# Altium footprint library 3.22-杂项.PcbLib: 985 footprints (part 55 of 64)
Each footprint in its own frame and in the unit in brackets; x right, y up, seen from the top. Pads: shape width x height; smd on the part's side, far side on the other; paste and mask are expansions set on the pad; w line width, h text height; cw(c..) or ccw(c..) is an arc to the next point about the centre after c.
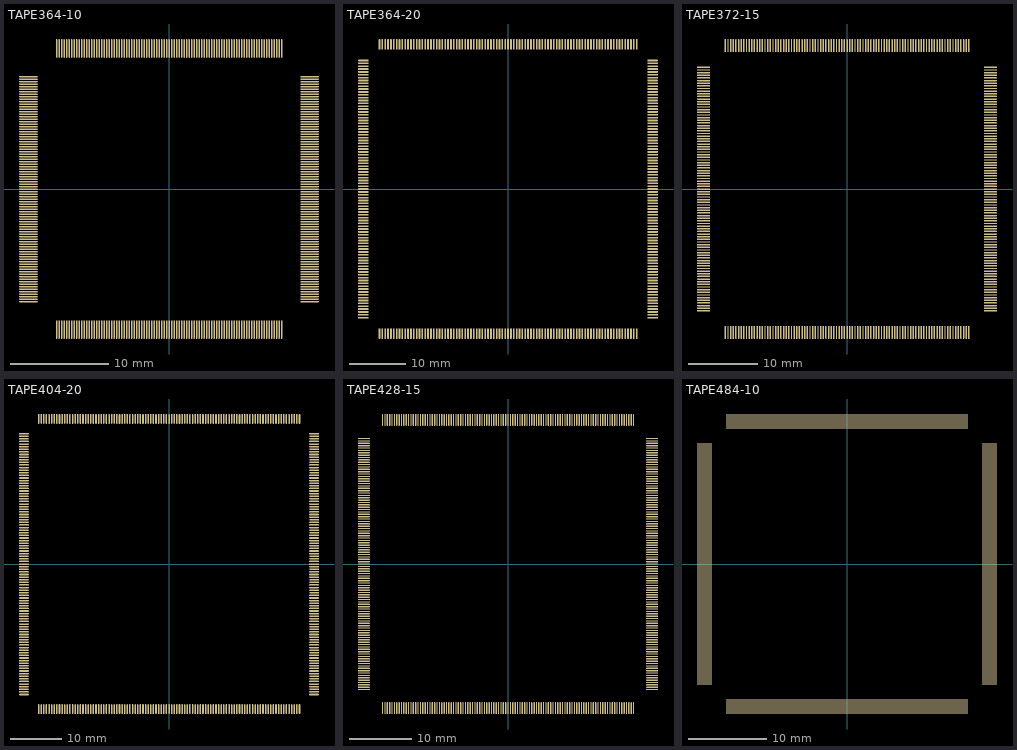
[diagram p54: the footprints below, top view; thin cyan lines are the x and y axes]

## TAPE364-10 [mil]
pads (364):
  oval 75x5 smd: 1(-562.5,449.5) 2(-562.5,439.5) 3(-562.5,429.5) 4(-562.5,419.5) 5(-562.5,409.5) 6(-562.5,399.5) 7(-562.5,389.5) 8(-562.5,379.5) 9(-562.5,369.5) 10(-562.5,359.5) 11(-562.5,349.5) 12(-562.5,339.5) 13(-562.5,329.5) 14(-562.5,319.5) 15(-562.5,309.5) 16(-562.5,299.5) 17(-562.5,289.5) 18(-562.5,279.5) 19(-562.5,269.5) 20(-562.5,259.5) 21(-562.5,249.5) 22(-562.5,239.5) 23(-562.5,229.5) 24(-562.5,219.5) 25(-562.5,209.5) 26(-562.5,199.5) 27(-562.5,189.5) 28(-562.5,179.5) 29(-562.5,169.5) 30(-562.5,159.5) 31(-562.5,149.5) 32(-562.5,139.5) 33(-562.5,129.5) 34(-562.5,119.5) 35(-562.5,109.5) 36(-562.5,99.5) 37(-562.5,89.5) 38(-562.5,79.5) 39(-562.5,69.5) 40(-562.5,59.5) 41(-562.5,49.5) 42(-562.5,39.5) 43(-562.5,29.5) 44(-562.5,19.5) 45(-562.5,9.5) 46(-562.5,-0.5) 47(-562.5,-10.5) 48(-562.5,-20.5) 49(-562.5,-30.5) 50(-562.5,-40.5) 51(-562.5,-50.5) 52(-562.5,-60.5) 53(-562.5,-70.5) 54(-562.5,-80.5) 55(-562.5,-90.5) 56(-562.5,-100.5) 57(-562.5,-110.5) 58(-562.5,-120.5) 59(-562.5,-130.5) 60(-562.5,-140.5) 61(-562.5,-150.5) 62(-562.5,-160.5) 63(-562.5,-170.5) 64(-562.5,-180.5) 65(-562.5,-190.5) 66(-562.5,-200.5) 67(-562.5,-210.5) 68(-562.5,-220.5) 69(-562.5,-230.5) 70(-562.5,-240.5) 71(-562.5,-250.5) 72(-562.5,-260.5) 73(-562.5,-270.5) 74(-562.5,-280.5) 75(-562.5,-290.5) 76(-562.5,-300.5) 77(-562.5,-310.5) 78(-562.5,-320.5) 79(-562.5,-330.5) 80(-562.5,-340.5) 81(-562.5,-350.5) 82(-562.5,-360.5) 83(-562.5,-370.5) 84(-562.5,-380.5) 85(-562.5,-390.5) 86(-562.5,-400.5) 87(-562.5,-410.5) 88(-562.5,-420.5) 89(-562.5,-430.5) 90(-562.5,-440.5) 91(-562.5,-450.5) 183(562.5,-450.5) 184(562.5,-440.5) 185(562.5,-430.5) 186(562.5,-420.5) 187(562.5,-410.5) 188(562.5,-400.5) 189(562.5,-390.5) 190(562.5,-380.5) 191(562.5,-370.5) 192(562.5,-360.5) 193(562.5,-350.5) 194(562.5,-340.5) 195(562.5,-330.5) 196(562.5,-320.5) 197(562.5,-310.5) 198(562.5,-300.5) 199(562.5,-290.5) 200(562.5,-280.5) 201(562.5,-270.5) 202(562.5,-260.5) 203(562.5,-250.5) 204(562.5,-240.5) 205(562.5,-230.5) 206(562.5,-220.5) 207(562.5,-210.5) 208(562.5,-200.5) 209(562.5,-190.5) 210(562.5,-180.5) 211(562.5,-170.5) 212(562.5,-160.5) 213(562.5,-150.5) 214(562.5,-140.5) 215(562.5,-130.5) 216(562.5,-120.5) 217(562.5,-110.5) 218(562.5,-100.5) 219(562.5,-90.5) 220(562.5,-80.5) 221(562.5,-70.5) 222(562.5,-60.5) 223(562.5,-50.5) 224(562.5,-40.5) 225(562.5,-30.5) 226(562.5,-20.5) 227(562.5,-10.5) 228(562.5,-0.5) 229(562.5,9.5) 230(562.5,19.5) 231(562.5,29.5) 232(562.5,39.5) 233(562.5,49.5) 234(562.5,59.5) 235(562.5,69.5) 236(562.5,79.5) 237(562.5,89.5) 238(562.5,99.5) 239(562.5,109.5) 240(562.5,119.5) 241(562.5,129.5) 242(562.5,139.5) 243(562.5,149.5) 244(562.5,159.5) 245(562.5,169.5) 246(562.5,179.5) 247(562.5,189.5) 248(562.5,199.5) 249(562.5,209.5) 250(562.5,219.5) 251(562.5,229.5) 252(562.5,239.5) 253(562.5,249.5) 254(562.5,259.5) 255(562.5,269.5) 256(562.5,279.5) 257(562.5,289.5) 258(562.5,299.5) 259(562.5,309.5) 260(562.5,319.5) 261(562.5,329.5) 262(562.5,339.5) 263(562.5,349.5) 264(562.5,359.5) 265(562.5,369.5) 266(562.5,379.5) 267(562.5,389.5) 268(562.5,399.5) 269(562.5,409.5) 270(562.5,419.5) 271(562.5,429.5) 272(562.5,439.5) 273(562.5,449.5)
  oval 5x75 smd: 92(-449.5,-562.5) 93(-439.5,-562.5) 94(-429.5,-562.5) 95(-419.5,-562.5) 96(-409.5,-562.5) 97(-399.5,-562.5) 98(-389.5,-562.5) 99(-379.5,-562.5) 100(-369.5,-562.5) 101(-359.5,-562.5) 102(-349.5,-562.5) 103(-339.5,-562.5) 104(-329.5,-562.5) 105(-319.5,-562.5) 106(-309.5,-562.5) 107(-299.5,-562.5) 108(-289.5,-562.5) 109(-279.5,-562.5) 110(-269.5,-562.5) 111(-259.5,-562.5) 112(-249.5,-562.5) 113(-239.5,-562.5) 114(-229.5,-562.5) 115(-219.5,-562.5) 116(-209.5,-562.5) 117(-199.5,-562.5) 118(-189.5,-562.5) 119(-179.5,-562.5) 120(-169.5,-562.5) 121(-159.5,-562.5) 122(-149.5,-562.5) 123(-139.5,-562.5) 124(-129.5,-562.5) 125(-119.5,-562.5) 126(-109.5,-562.5) 127(-99.5,-562.5) 128(-89.5,-562.5) 129(-79.5,-562.5) 130(-69.5,-562.5) 131(-59.5,-562.5) 132(-49.5,-562.5) 133(-39.5,-562.5) 134(-29.5,-562.5) 135(-19.5,-562.5) 136(-9.5,-562.5) 137(0.5,-562.5) 138(10.5,-562.5) 139(20.5,-562.5) 140(30.5,-562.5) 141(40.5,-562.5) 142(50.5,-562.5) 143(60.5,-562.5) 144(70.5,-562.5) 145(80.5,-562.5) 146(90.5,-562.5) 147(100.5,-562.5) 148(110.5,-562.5) 149(120.5,-562.5) 150(130.5,-562.5) 151(140.5,-562.5) 152(150.5,-562.5) 153(160.5,-562.5) 154(170.5,-562.5) 155(180.5,-562.5) 156(190.5,-562.5) 157(200.5,-562.5) 158(210.5,-562.5) 159(220.5,-562.5) 160(230.5,-562.5) 161(240.5,-562.5) 162(250.5,-562.5) 163(260.5,-562.5) 164(270.5,-562.5) 165(280.5,-562.5) 166(290.5,-562.5) 167(300.5,-562.5) 168(310.5,-562.5) 169(320.5,-562.5) 170(330.5,-562.5) 171(340.5,-562.5) 172(350.5,-562.5) 173(360.5,-562.5) 174(370.5,-562.5) 175(380.5,-562.5) 176(390.5,-562.5) 177(400.5,-562.5) 178(410.5,-562.5) 179(420.5,-562.5) 180(430.5,-562.5) 181(440.5,-562.5) 182(450.5,-562.5) 274(450.5,562.5) 275(440.5,562.5) 276(430.5,562.5) 277(420.5,562.5) 278(410.5,562.5) 279(400.5,562.5) 280(390.5,562.5) 281(380.5,562.5) 282(370.5,562.5) 283(360.5,562.5) 284(350.5,562.5) 285(340.5,562.5) 286(330.5,562.5) 287(320.5,562.5) 288(310.5,562.5) 289(300.5,562.5) 290(290.5,562.5) 291(280.5,562.5) 292(270.5,562.5) 293(260.5,562.5) 294(250.5,562.5) 295(240.5,562.5) 296(230.5,562.5) 297(220.5,562.5) 298(210.5,562.5) 299(200.5,562.5) 300(190.5,562.5) 301(180.5,562.5) 302(170.5,562.5) 303(160.5,562.5) 304(150.5,562.5) 305(140.5,562.5) 306(130.5,562.5) 307(120.5,562.5) 308(110.5,562.5) 309(100.5,562.5) 310(90.5,562.5) 311(80.5,562.5) 312(70.5,562.5) 313(60.5,562.5) 314(50.5,562.5) 315(40.5,562.5) 316(30.5,562.5) 317(20.5,562.5) 318(10.5,562.5) 319(0.5,562.5) 320(-9.5,562.5) 321(-19.5,562.5) 322(-29.5,562.5) 323(-39.5,562.5) 324(-49.5,562.5) 325(-59.5,562.5) 326(-69.5,562.5) 327(-79.5,562.5) 328(-89.5,562.5) 329(-99.5,562.5) 330(-109.5,562.5) 331(-119.5,562.5) 332(-129.5,562.5) 333(-139.5,562.5) 334(-149.5,562.5) 335(-159.5,562.5) 336(-169.5,562.5) 337(-179.5,562.5) 338(-189.5,562.5) 339(-199.5,562.5) 340(-209.5,562.5) 341(-219.5,562.5) 342(-229.5,562.5) 343(-239.5,562.5) 344(-249.5,562.5) 345(-259.5,562.5) 346(-269.5,562.5) 347(-279.5,562.5) 348(-289.5,562.5) 349(-299.5,562.5) 350(-309.5,562.5) 351(-319.5,562.5) 352(-329.5,562.5) 353(-339.5,562.5) 354(-349.5,562.5) 355(-359.5,562.5) 356(-369.5,562.5) 357(-379.5,562.5) 358(-389.5,562.5) 359(-399.5,562.5) 360(-409.5,562.5) 361(-419.5,562.5) 362(-429.5,562.5) 363(-439.5,562.5) 364(-449.5,562.5)

## TAPE364-20 [mil]
pads (364):
  oval 75x12 smd: 1(-1012.5,899.5) 2(-1012.5,879.5) 3(-1012.5,859.5) 4(-1012.5,839.5) 5(-1012.5,819.5) 6(-1012.5,799.5) 7(-1012.5,779.5) 8(-1012.5,759.5) 9(-1012.5,739.5) 10(-1012.5,719.5) 11(-1012.5,699.5) 12(-1012.5,679.5) 13(-1012.5,659.5) 14(-1012.5,639.5) 15(-1012.5,619.5) 16(-1012.5,599.5) 17(-1012.5,579.5) 18(-1012.5,559.5) 19(-1012.5,539.5) 20(-1012.5,519.5) 21(-1012.5,499.5) 22(-1012.5,479.5) 23(-1012.5,459.5) 24(-1012.5,439.5) 25(-1012.5,419.5) 26(-1012.5,399.5) 27(-1012.5,379.5) 28(-1012.5,359.5) 29(-1012.5,339.5) 30(-1012.5,319.5) 31(-1012.5,299.5) 32(-1012.5,279.5) 33(-1012.5,259.5) 34(-1012.5,239.5) 35(-1012.5,219.5) 36(-1012.5,199.5) 37(-1012.5,179.5) 38(-1012.5,159.5) 39(-1012.5,139.5) 40(-1012.5,119.5) 41(-1012.5,99.5) 42(-1012.5,79.5) 43(-1012.5,59.5) 44(-1012.5,39.5) 45(-1012.5,19.5) 46(-1012.5,-0.5) 47(-1012.5,-20.5) 48(-1012.5,-40.5) 49(-1012.5,-60.5) 50(-1012.5,-80.5) 51(-1012.5,-100.5) 52(-1012.5,-120.5) 53(-1012.5,-140.5) 54(-1012.5,-160.5) 55(-1012.5,-180.5) 56(-1012.5,-200.5) 57(-1012.5,-220.5) 58(-1012.5,-240.5) 59(-1012.5,-260.5) 60(-1012.5,-280.5) 61(-1012.5,-300.5) 62(-1012.5,-320.5) 63(-1012.5,-340.5) 64(-1012.5,-360.5) 65(-1012.5,-380.5) 66(-1012.5,-400.5) 67(-1012.5,-420.5) 68(-1012.5,-440.5) 69(-1012.5,-460.5) 70(-1012.5,-480.5) 71(-1012.5,-500.5) 72(-1012.5,-520.5) 73(-1012.5,-540.5) 74(-1012.5,-560.5) 75(-1012.5,-580.5) 76(-1012.5,-600.5) 77(-1012.5,-620.5) 78(-1012.5,-640.5) 79(-1012.5,-660.5) 80(-1012.5,-680.5) 81(-1012.5,-700.5) 82(-1012.5,-720.5) 83(-1012.5,-740.5) 84(-1012.5,-760.5) 85(-1012.5,-780.5) 86(-1012.5,-800.5) 87(-1012.5,-820.5) 88(-1012.5,-840.5) 89(-1012.5,-860.5) 90(-1012.5,-880.5) 91(-1012.5,-900.5) 183(1012.5,-900.5) 184(1012.5,-880.5) 185(1012.5,-860.5) 186(1012.5,-840.5) 187(1012.5,-820.5) 188(1012.5,-800.5) 189(1012.5,-780.5) 190(1012.5,-760.5) 191(1012.5,-740.5) 192(1012.5,-720.5) 193(1012.5,-700.5) 194(1012.5,-680.5) 195(1012.5,-660.5) 196(1012.5,-640.5) 197(1012.5,-620.5) 198(1012.5,-600.5) 199(1012.5,-580.5) 200(1012.5,-560.5) 201(1012.5,-540.5) 202(1012.5,-520.5) 203(1012.5,-500.5) 204(1012.5,-480.5) 205(1012.5,-460.5) 206(1012.5,-440.5) 207(1012.5,-420.5) 208(1012.5,-400.5) 209(1012.5,-380.5) 210(1012.5,-360.5) 211(1012.5,-340.5) 212(1012.5,-320.5) 213(1012.5,-300.5) 214(1012.5,-280.5) 215(1012.5,-260.5) 216(1012.5,-240.5) 217(1012.5,-220.5) 218(1012.5,-200.5) 219(1012.5,-180.5) 220(1012.5,-160.5) 221(1012.5,-140.5) 222(1012.5,-120.5) 223(1012.5,-100.5) 224(1012.5,-80.5) 225(1012.5,-60.5) 226(1012.5,-40.5) 227(1012.5,-20.5) 228(1012.5,-0.5) 229(1012.5,19.5) 230(1012.5,39.5) 231(1012.5,59.5) 232(1012.5,79.5) 233(1012.5,99.5) 234(1012.5,119.5) 235(1012.5,139.5) 236(1012.5,159.5) 237(1012.5,179.5) 238(1012.5,199.5) 239(1012.5,219.5) 240(1012.5,239.5) 241(1012.5,259.5) 242(1012.5,279.5) 243(1012.5,299.5) 244(1012.5,319.5) 245(1012.5,339.5) 246(1012.5,359.5) 247(1012.5,379.5) 248(1012.5,399.5) 249(1012.5,419.5) 250(1012.5,439.5) 251(1012.5,459.5) 252(1012.5,479.5) 253(1012.5,499.5) 254(1012.5,519.5) 255(1012.5,539.5) 256(1012.5,559.5) 257(1012.5,579.5) 258(1012.5,599.5) 259(1012.5,619.5) 260(1012.5,639.5) 261(1012.5,659.5) 262(1012.5,679.5) 263(1012.5,699.5) 264(1012.5,719.5) 265(1012.5,739.5) 266(1012.5,759.5) 267(1012.5,779.5) 268(1012.5,799.5) 269(1012.5,819.5) 270(1012.5,839.5) 271(1012.5,859.5) 272(1012.5,879.5) 273(1012.5,899.5)
  oval 12x75 smd: 92(-899.5,-1012.5) 93(-879.5,-1012.5) 94(-859.5,-1012.5) 95(-839.5,-1012.5) 96(-819.5,-1012.5) 97(-799.5,-1012.5) 98(-779.5,-1012.5) 99(-759.5,-1012.5) 100(-739.5,-1012.5) 101(-719.5,-1012.5) 102(-699.5,-1012.5) 103(-679.5,-1012.5) 104(-659.5,-1012.5) 105(-639.5,-1012.5) 106(-619.5,-1012.5) 107(-599.5,-1012.5) 108(-579.5,-1012.5) 109(-559.5,-1012.5) 110(-539.5,-1012.5) 111(-519.5,-1012.5) 112(-499.5,-1012.5) 113(-479.5,-1012.5) 114(-459.5,-1012.5) 115(-439.5,-1012.5) 116(-419.5,-1012.5) 117(-399.5,-1012.5) 118(-379.5,-1012.5) 119(-359.5,-1012.5) 120(-339.5,-1012.5) 121(-319.5,-1012.5) 122(-299.5,-1012.5) 123(-279.5,-1012.5) 124(-259.5,-1012.5) 125(-239.5,-1012.5) 126(-219.5,-1012.5) 127(-199.5,-1012.5) 128(-179.5,-1012.5) 129(-159.5,-1012.5) 130(-139.5,-1012.5) 131(-119.5,-1012.5) 132(-99.5,-1012.5) 133(-79.5,-1012.5) 134(-59.5,-1012.5) 135(-39.5,-1012.5) 136(-19.5,-1012.5) 137(0.5,-1012.5) 138(20.5,-1012.5) 139(40.5,-1012.5) 140(60.5,-1012.5) 141(80.5,-1012.5) 142(100.5,-1012.5) 143(120.5,-1012.5) 144(140.5,-1012.5) 145(160.5,-1012.5) 146(180.5,-1012.5) 147(200.5,-1012.5) 148(220.5,-1012.5) 149(240.5,-1012.5) 150(260.5,-1012.5) 151(280.5,-1012.5) 152(300.5,-1012.5) 153(320.5,-1012.5) 154(340.5,-1012.5) 155(360.5,-1012.5) 156(380.5,-1012.5) 157(400.5,-1012.5) 158(420.5,-1012.5) 159(440.5,-1012.5) 160(460.5,-1012.5) 161(480.5,-1012.5) 162(500.5,-1012.5) 163(520.5,-1012.5) 164(540.5,-1012.5) 165(560.5,-1012.5) 166(580.5,-1012.5) 167(600.5,-1012.5) 168(620.5,-1012.5) 169(640.5,-1012.5) 170(660.5,-1012.5) 171(680.5,-1012.5) 172(700.5,-1012.5) 173(720.5,-1012.5) 174(740.5,-1012.5) 175(760.5,-1012.5) 176(780.5,-1012.5) 177(800.5,-1012.5) 178(820.5,-1012.5) 179(840.5,-1012.5) 180(860.5,-1012.5) 181(880.5,-1012.5) 182(900.5,-1012.5) 274(900.5,1012.5) 275(880.5,1012.5) 276(860.5,1012.5) 277(840.5,1012.5) 278(820.5,1012.5) 279(800.5,1012.5) 280(780.5,1012.5) 281(760.5,1012.5) 282(740.5,1012.5) 283(720.5,1012.5) 284(700.5,1012.5) 285(680.5,1012.5) 286(660.5,1012.5) 287(640.5,1012.5) 288(620.5,1012.5) 289(600.5,1012.5) 290(580.5,1012.5) 291(560.5,1012.5) 292(540.5,1012.5) 293(520.5,1012.5) 294(500.5,1012.5) 295(480.5,1012.5) 296(460.5,1012.5) 297(440.5,1012.5) 298(420.5,1012.5) 299(400.5,1012.5) 300(380.5,1012.5) 301(360.5,1012.5) 302(340.5,1012.5) 303(320.5,1012.5) 304(300.5,1012.5) 305(280.5,1012.5) 306(260.5,1012.5) 307(240.5,1012.5) 308(220.5,1012.5) 309(200.5,1012.5) 310(180.5,1012.5) 311(160.5,1012.5) 312(140.5,1012.5) 313(120.5,1012.5) 314(100.5,1012.5) 315(80.5,1012.5) 316(60.5,1012.5) 317(40.5,1012.5) 318(20.5,1012.5) 319(0.5,1012.5) 320(-19.5,1012.5) 321(-39.5,1012.5) 322(-59.5,1012.5) 323(-79.5,1012.5) 324(-99.5,1012.5) 325(-119.5,1012.5) 326(-139.5,1012.5) 327(-159.5,1012.5) 328(-179.5,1012.5) 329(-199.5,1012.5) 330(-219.5,1012.5) 331(-239.5,1012.5) 332(-259.5,1012.5) 333(-279.5,1012.5) 334(-299.5,1012.5) 335(-319.5,1012.5) 336(-339.5,1012.5) 337(-359.5,1012.5) 338(-379.5,1012.5) 339(-399.5,1012.5) 340(-419.5,1012.5) 341(-439.5,1012.5) 342(-459.5,1012.5) 343(-479.5,1012.5) 344(-499.5,1012.5) 345(-519.5,1012.5) 346(-539.5,1012.5) 347(-559.5,1012.5) 348(-579.5,1012.5) 349(-599.5,1012.5) 350(-619.5,1012.5) 351(-639.5,1012.5) 352(-659.5,1012.5) 353(-679.5,1012.5) 354(-699.5,1012.5) 355(-719.5,1012.5) 356(-739.5,1012.5) 357(-759.5,1012.5) 358(-779.5,1012.5) 359(-799.5,1012.5) 360(-819.5,1012.5) 361(-839.5,1012.5) 362(-859.5,1012.5) 363(-879.5,1012.5) 364(-899.5,1012.5)

## TAPE372-15 [mil]
pads (372):
  oval 75x8 smd: 1(-812.5,689.5) 2(-812.5,674.5) 3(-812.5,659.5) 4(-812.5,644.5) 5(-812.5,629.5) 6(-812.5,614.5) 7(-812.5,599.5) 8(-812.5,584.5) 9(-812.5,569.5) 10(-812.5,554.5) 11(-812.5,539.5) 12(-812.5,524.5) 13(-812.5,509.5) 14(-812.5,494.5) 15(-812.5,479.5) 16(-812.5,464.5) 17(-812.5,449.5) 18(-812.5,434.5) 19(-812.5,419.5) 20(-812.5,404.5) 21(-812.5,389.5) 22(-812.5,374.5) 23(-812.5,359.5) 24(-812.5,344.5) 25(-812.5,329.5) 26(-812.5,314.5) 27(-812.5,299.5) 28(-812.5,284.5) 29(-812.5,269.5) 30(-812.5,254.5) 31(-812.5,239.5) 32(-812.5,224.5) 33(-812.5,209.5) 34(-812.5,194.5) 35(-812.5,179.5) 36(-812.5,164.5) 37(-812.5,149.5) 38(-812.5,134.5) 39(-812.5,119.5) 40(-812.5,104.5) 41(-812.5,89.5) 42(-812.5,74.5) 43(-812.5,59.5) 44(-812.5,44.5) 45(-812.5,29.5) 46(-812.5,14.5) 47(-812.5,-0.5) 48(-812.5,-15.5) 49(-812.5,-30.5) 50(-812.5,-45.5) 51(-812.5,-60.5) 52(-812.5,-75.5) 53(-812.5,-90.5) 54(-812.5,-105.5) 55(-812.5,-120.5) 56(-812.5,-135.5) 57(-812.5,-150.5) 58(-812.5,-165.5) 59(-812.5,-180.5) 60(-812.5,-195.5) 61(-812.5,-210.5) 62(-812.5,-225.5) 63(-812.5,-240.5) 64(-812.5,-255.5) 65(-812.5,-270.5) 66(-812.5,-285.5) 67(-812.5,-300.5) 68(-812.5,-315.5) 69(-812.5,-330.5) 70(-812.5,-345.5) 71(-812.5,-360.5) 72(-812.5,-375.5) 73(-812.5,-390.5) 74(-812.5,-405.5) 75(-812.5,-420.5) 76(-812.5,-435.5) 77(-812.5,-450.5) 78(-812.5,-465.5) 79(-812.5,-480.5) 80(-812.5,-495.5) 81(-812.5,-510.5) 82(-812.5,-525.5) 83(-812.5,-540.5) 84(-812.5,-555.5) 85(-812.5,-570.5) 86(-812.5,-585.5) 87(-812.5,-600.5) 88(-812.5,-615.5) 89(-812.5,-630.5) 90(-812.5,-645.5) 91(-812.5,-660.5) 92(-812.5,-675.5) 93(-812.5,-690.5) 187(812.5,-690.5) 188(812.5,-675.5) 189(812.5,-660.5) 190(812.5,-645.5) 191(812.5,-630.5) 192(812.5,-615.5) 193(812.5,-600.5) 194(812.5,-585.5) 195(812.5,-570.5) 196(812.5,-555.5) 197(812.5,-540.5) 198(812.5,-525.5) 199(812.5,-510.5) 200(812.5,-495.5) 201(812.5,-480.5) 202(812.5,-465.5) 203(812.5,-450.5) 204(812.5,-435.5) 205(812.5,-420.5) 206(812.5,-405.5) 207(812.5,-390.5) 208(812.5,-375.5) 209(812.5,-360.5) 210(812.5,-345.5) 211(812.5,-330.5) 212(812.5,-315.5) 213(812.5,-300.5) 214(812.5,-285.5) 215(812.5,-270.5) 216(812.5,-255.5) 217(812.5,-240.5) 218(812.5,-225.5) 219(812.5,-210.5) 220(812.5,-195.5) 221(812.5,-180.5) 222(812.5,-165.5) 223(812.5,-150.5) 224(812.5,-135.5) 225(812.5,-120.5) 226(812.5,-105.5) 227(812.5,-90.5) 228(812.5,-75.5) 229(812.5,-60.5) 230(812.5,-45.5) 231(812.5,-30.5) 232(812.5,-15.5) 233(812.5,-0.5) 234(812.5,14.5) 235(812.5,29.5) 236(812.5,44.5) 237(812.5,59.5) 238(812.5,74.5) 239(812.5,89.5) 240(812.5,104.5) 241(812.5,119.5) 242(812.5,134.5) 243(812.5,149.5) 244(812.5,164.5) 245(812.5,179.5) 246(812.5,194.5) 247(812.5,209.5) 248(812.5,224.5) 249(812.5,239.5) 250(812.5,254.5) 251(812.5,269.5) 252(812.5,284.5) 253(812.5,299.5) 254(812.5,314.5) 255(812.5,329.5) 256(812.5,344.5) 257(812.5,359.5) 258(812.5,374.5) 259(812.5,389.5) 260(812.5,404.5) 261(812.5,419.5) 262(812.5,434.5) 263(812.5,449.5) 264(812.5,464.5) 265(812.5,479.5) 266(812.5,494.5) 267(812.5,509.5) 268(812.5,524.5) 269(812.5,539.5) 270(812.5,554.5) 271(812.5,569.5) 272(812.5,584.5) 273(812.5,599.5) 274(812.5,614.5) 275(812.5,629.5) 276(812.5,644.5) 277(812.5,659.5) 278(812.5,674.5) 279(812.5,689.5)
  oval 8x75 smd: 94(-689.5,-812.5) 95(-674.5,-812.5) 96(-659.5,-812.5) 97(-644.5,-812.5) 98(-629.5,-812.5) 99(-614.5,-812.5) 100(-599.5,-812.5) 101(-584.5,-812.5) 102(-569.5,-812.5) 103(-554.5,-812.5) 104(-539.5,-812.5) 105(-524.5,-812.5) 106(-509.5,-812.5) 107(-494.5,-812.5) 108(-479.5,-812.5) 109(-464.5,-812.5) 110(-449.5,-812.5) 111(-434.5,-812.5) 112(-419.5,-812.5) 113(-404.5,-812.5) 114(-389.5,-812.5) 115(-374.5,-812.5) 116(-359.5,-812.5) 117(-344.5,-812.5) 118(-329.5,-812.5) 119(-314.5,-812.5) 120(-299.5,-812.5) 121(-284.5,-812.5) 122(-269.5,-812.5) 123(-254.5,-812.5) 124(-239.5,-812.5) 125(-224.5,-812.5) 126(-209.5,-812.5) 127(-194.5,-812.5) 128(-179.5,-812.5) 129(-164.5,-812.5) 130(-149.5,-812.5) 131(-134.5,-812.5) 132(-119.5,-812.5) 133(-104.5,-812.5) 134(-89.5,-812.5) 135(-74.5,-812.5) 136(-59.5,-812.5) 137(-44.5,-812.5) 138(-29.5,-812.5) 139(-14.5,-812.5) 140(0.5,-812.5) 141(15.5,-812.5) 142(30.5,-812.5) 143(45.5,-812.5) 144(60.5,-812.5) 145(75.5,-812.5) 146(90.5,-812.5) 147(105.5,-812.5) 148(120.5,-812.5) 149(135.5,-812.5) 150(150.5,-812.5) 151(165.5,-812.5) 152(180.5,-812.5) 153(195.5,-812.5) 154(210.5,-812.5) 155(225.5,-812.5) 156(240.5,-812.5) 157(255.5,-812.5) 158(270.5,-812.5) 159(285.5,-812.5) 160(300.5,-812.5) 161(315.5,-812.5) 162(330.5,-812.5) 163(345.5,-812.5) 164(360.5,-812.5) 165(375.5,-812.5) 166(390.5,-812.5) 167(405.5,-812.5) 168(420.5,-812.5) 169(435.5,-812.5) 170(450.5,-812.5) 171(465.5,-812.5) 172(480.5,-812.5) 173(495.5,-812.5) 174(510.5,-812.5) 175(525.5,-812.5) 176(540.5,-812.5) 177(555.5,-812.5) 178(570.5,-812.5) 179(585.5,-812.5) 180(600.5,-812.5) 181(615.5,-812.5) 182(630.5,-812.5) 183(645.5,-812.5) 184(660.5,-812.5) 185(675.5,-812.5) 186(690.5,-812.5) 280(690.5,812.5) 281(675.5,812.5) 282(660.5,812.5) 283(645.5,812.5) 284(630.5,812.5) 285(615.5,812.5) 286(600.5,812.5) 287(585.5,812.5) 288(570.5,812.5) 289(555.5,812.5) 290(540.5,812.5) 291(525.5,812.5) 292(510.5,812.5) 293(495.5,812.5) 294(480.5,812.5) 295(465.5,812.5) 296(450.5,812.5) 297(435.5,812.5) 298(420.5,812.5) 299(405.5,812.5) 300(390.5,812.5) 301(375.5,812.5) 302(360.5,812.5) 303(345.5,812.5) 304(330.5,812.5) 305(315.5,812.5) 306(300.5,812.5) 307(285.5,812.5) 308(270.5,812.5) 309(255.5,812.5) 310(240.5,812.5) 311(225.5,812.5) 312(210.5,812.5) 313(195.5,812.5) 314(180.5,812.5) 315(165.5,812.5) 316(150.5,812.5) 317(135.5,812.5) 318(120.5,812.5) 319(105.5,812.5) 320(90.5,812.5) 321(75.5,812.5) 322(60.5,812.5) 323(45.5,812.5) 324(30.5,812.5) 325(15.5,812.5) 326(0.5,812.5) 327(-14.5,812.5) 328(-29.5,812.5) 329(-44.5,812.5) 330(-59.5,812.5) 331(-74.5,812.5) 332(-89.5,812.5) 333(-104.5,812.5) 334(-119.5,812.5) 335(-134.5,812.5) 336(-149.5,812.5) 337(-164.5,812.5) 338(-179.5,812.5) 339(-194.5,812.5) 340(-209.5,812.5) 341(-224.5,812.5) 342(-239.5,812.5) 343(-254.5,812.5) 344(-269.5,812.5) 345(-284.5,812.5) 346(-299.5,812.5) 347(-314.5,812.5) 348(-329.5,812.5) 349(-344.5,812.5) 350(-359.5,812.5) 351(-374.5,812.5) 352(-389.5,812.5) 353(-404.5,812.5) 354(-419.5,812.5) 355(-434.5,812.5) 356(-449.5,812.5) 357(-464.5,812.5) 358(-479.5,812.5) 359(-494.5,812.5) 360(-509.5,812.5) 361(-524.5,812.5) 362(-539.5,812.5) 363(-554.5,812.5) 364(-569.5,812.5) 365(-584.5,812.5) 366(-599.5,812.5) 367(-614.5,812.5) 368(-629.5,812.5) 369(-644.5,812.5) 370(-659.5,812.5) 371(-674.5,812.5) 372(-689.5,812.5)

## TAPE404-20 [mil]
pads (404):
  oval 75x12 smd: 1(-1112.5,999.5) 2(-1112.5,979.5) 3(-1112.5,959.5) 4(-1112.5,939.5) 5(-1112.5,919.5) 6(-1112.5,899.5) 7(-1112.5,879.5) 8(-1112.5,859.5) 9(-1112.5,839.5) 10(-1112.5,819.5) 11(-1112.5,799.5) 12(-1112.5,779.5) 13(-1112.5,759.5) 14(-1112.5,739.5) 15(-1112.5,719.5) 16(-1112.5,699.5) 17(-1112.5,679.5) 18(-1112.5,659.5) 19(-1112.5,639.5) 20(-1112.5,619.5) 21(-1112.5,599.5) 22(-1112.5,579.5) 23(-1112.5,559.5) 24(-1112.5,539.5) 25(-1112.5,519.5) 26(-1112.5,499.5) 27(-1112.5,479.5) 28(-1112.5,459.5) 29(-1112.5,439.5) 30(-1112.5,419.5) 31(-1112.5,399.5) 32(-1112.5,379.5) 33(-1112.5,359.5) 34(-1112.5,339.5) 35(-1112.5,319.5) 36(-1112.5,299.5) 37(-1112.5,279.5) 38(-1112.5,259.5) 39(-1112.5,239.5) 40(-1112.5,219.5) 41(-1112.5,199.5) 42(-1112.5,179.5) 43(-1112.5,159.5) 44(-1112.5,139.5) 45(-1112.5,119.5) 46(-1112.5,99.5) 47(-1112.5,79.5) 48(-1112.5,59.5) 49(-1112.5,39.5) 50(-1112.5,19.5) 51(-1112.5,-0.5) 52(-1112.5,-20.5) 53(-1112.5,-40.5) 54(-1112.5,-60.5) 55(-1112.5,-80.5) 56(-1112.5,-100.5) 57(-1112.5,-120.5) 58(-1112.5,-140.5) 59(-1112.5,-160.5) 60(-1112.5,-180.5) 61(-1112.5,-200.5) 62(-1112.5,-220.5) 63(-1112.5,-240.5) 64(-1112.5,-260.5) 65(-1112.5,-280.5) 66(-1112.5,-300.5) 67(-1112.5,-320.5) 68(-1112.5,-340.5) 69(-1112.5,-360.5) 70(-1112.5,-380.5) 71(-1112.5,-400.5) 72(-1112.5,-420.5) 73(-1112.5,-440.5) 74(-1112.5,-460.5) 75(-1112.5,-480.5) 76(-1112.5,-500.5) 77(-1112.5,-520.5) 78(-1112.5,-540.5) 79(-1112.5,-560.5) 80(-1112.5,-580.5) 81(-1112.5,-600.5) 82(-1112.5,-620.5) 83(-1112.5,-640.5) 84(-1112.5,-660.5) 85(-1112.5,-680.5) 86(-1112.5,-700.5) 87(-1112.5,-720.5) 88(-1112.5,-740.5) 89(-1112.5,-760.5) 90(-1112.5,-780.5) 91(-1112.5,-800.5) 92(-1112.5,-820.5) 93(-1112.5,-840.5) 94(-1112.5,-860.5) 95(-1112.5,-880.5) 96(-1112.5,-900.5) 97(-1112.5,-920.5) 98(-1112.5,-940.5) 99(-1112.5,-960.5) 100(-1112.5,-980.5) 101(-1112.5,-1000.5) 203(1112.5,-1000.5) 204(1112.5,-980.5) 205(1112.5,-960.5) 206(1112.5,-940.5) 207(1112.5,-920.5) 208(1112.5,-900.5) 209(1112.5,-880.5) 210(1112.5,-860.5) 211(1112.5,-840.5) 212(1112.5,-820.5) 213(1112.5,-800.5) 214(1112.5,-780.5) 215(1112.5,-760.5) 216(1112.5,-740.5) 217(1112.5,-720.5) 218(1112.5,-700.5) 219(1112.5,-680.5) 220(1112.5,-660.5) 221(1112.5,-640.5) 222(1112.5,-620.5) 223(1112.5,-600.5) 224(1112.5,-580.5) 225(1112.5,-560.5) 226(1112.5,-540.5) 227(1112.5,-520.5) 228(1112.5,-500.5) 229(1112.5,-480.5) 230(1112.5,-460.5) 231(1112.5,-440.5) 232(1112.5,-420.5) 233(1112.5,-400.5) 234(1112.5,-380.5) 235(1112.5,-360.5) 236(1112.5,-340.5) 237(1112.5,-320.5) 238(1112.5,-300.5) 239(1112.5,-280.5) 240(1112.5,-260.5) 241(1112.5,-240.5) 242(1112.5,-220.5) 243(1112.5,-200.5) 244(1112.5,-180.5) 245(1112.5,-160.5) 246(1112.5,-140.5) 247(1112.5,-120.5) 248(1112.5,-100.5) 249(1112.5,-80.5) 250(1112.5,-60.5) 251(1112.5,-40.5) 252(1112.5,-20.5) 253(1112.5,-0.5) 254(1112.5,19.5) 255(1112.5,39.5) 256(1112.5,59.5) 257(1112.5,79.5) 258(1112.5,99.5) 259(1112.5,119.5) 260(1112.5,139.5) 261(1112.5,159.5) 262(1112.5,179.5) 263(1112.5,199.5) 264(1112.5,219.5) 265(1112.5,239.5) 266(1112.5,259.5) 267(1112.5,279.5) 268(1112.5,299.5) 269(1112.5,319.5) 270(1112.5,339.5) 271(1112.5,359.5) 272(1112.5,379.5) 273(1112.5,399.5) 274(1112.5,419.5) 275(1112.5,439.5) 276(1112.5,459.5) 277(1112.5,479.5) 278(1112.5,499.5) 279(1112.5,519.5) 280(1112.5,539.5) 281(1112.5,559.5) 282(1112.5,579.5) 283(1112.5,599.5) 284(1112.5,619.5) 285(1112.5,639.5) 286(1112.5,659.5) 287(1112.5,679.5) 288(1112.5,699.5) 289(1112.5,719.5) 290(1112.5,739.5) 291(1112.5,759.5) 292(1112.5,779.5) 293(1112.5,799.5) 294(1112.5,819.5) 295(1112.5,839.5) 296(1112.5,859.5) 297(1112.5,879.5) 298(1112.5,899.5) 299(1112.5,919.5) 300(1112.5,939.5) 301(1112.5,959.5) 302(1112.5,979.5) 303(1112.5,999.5)
  oval 12x75 smd: 102(-999.5,-1112.5) 103(-979.5,-1112.5) 104(-959.5,-1112.5) 105(-939.5,-1112.5) 106(-919.5,-1112.5) 107(-899.5,-1112.5) 108(-879.5,-1112.5) 109(-859.5,-1112.5) 110(-839.5,-1112.5) 111(-819.5,-1112.5) 112(-799.5,-1112.5) 113(-779.5,-1112.5) 114(-759.5,-1112.5) 115(-739.5,-1112.5) 116(-719.5,-1112.5) 117(-699.5,-1112.5) 118(-679.5,-1112.5) 119(-659.5,-1112.5) 120(-639.5,-1112.5) 121(-619.5,-1112.5) 122(-599.5,-1112.5) 123(-579.5,-1112.5) 124(-559.5,-1112.5) 125(-539.5,-1112.5) 126(-519.5,-1112.5) 127(-499.5,-1112.5) 128(-479.5,-1112.5) 129(-459.5,-1112.5) 130(-439.5,-1112.5) 131(-419.5,-1112.5) 132(-399.5,-1112.5) 133(-379.5,-1112.5) 134(-359.5,-1112.5) 135(-339.5,-1112.5) 136(-319.5,-1112.5) 137(-299.5,-1112.5) 138(-279.5,-1112.5) 139(-259.5,-1112.5) 140(-239.5,-1112.5) 141(-219.5,-1112.5) 142(-199.5,-1112.5) 143(-179.5,-1112.5) 144(-159.5,-1112.5) 145(-139.5,-1112.5) 146(-119.5,-1112.5) 147(-99.5,-1112.5) 148(-79.5,-1112.5) 149(-59.5,-1112.5) 150(-39.5,-1112.5) 151(-19.5,-1112.5) 152(0.5,-1112.5) 153(20.5,-1112.5) 154(40.5,-1112.5) 155(60.5,-1112.5) 156(80.5,-1112.5) 157(100.5,-1112.5) 158(120.5,-1112.5) 159(140.5,-1112.5) 160(160.5,-1112.5) 161(180.5,-1112.5) 162(200.5,-1112.5) 163(220.5,-1112.5) 164(240.5,-1112.5) 165(260.5,-1112.5) 166(280.5,-1112.5) 167(300.5,-1112.5) 168(320.5,-1112.5) 169(340.5,-1112.5) 170(360.5,-1112.5) 171(380.5,-1112.5) 172(400.5,-1112.5) 173(420.5,-1112.5) 174(440.5,-1112.5) 175(460.5,-1112.5) 176(480.5,-1112.5) 177(500.5,-1112.5) 178(520.5,-1112.5) 179(540.5,-1112.5) 180(560.5,-1112.5) 181(580.5,-1112.5) 182(600.5,-1112.5) 183(620.5,-1112.5) 184(640.5,-1112.5) 185(660.5,-1112.5) 186(680.5,-1112.5) 187(700.5,-1112.5) 188(720.5,-1112.5) 189(740.5,-1112.5) 190(760.5,-1112.5) 191(780.5,-1112.5) 192(800.5,-1112.5) 193(820.5,-1112.5) 194(840.5,-1112.5) 195(860.5,-1112.5) 196(880.5,-1112.5) 197(900.5,-1112.5) 198(920.5,-1112.5) 199(940.5,-1112.5) 200(960.5,-1112.5) 201(980.5,-1112.5) 202(1000.5,-1112.5) 304(1000.5,1112.5) 305(980.5,1112.5) 306(960.5,1112.5) 307(940.5,1112.5) 308(920.5,1112.5) 309(900.5,1112.5) 310(880.5,1112.5) 311(860.5,1112.5) 312(840.5,1112.5) 313(820.5,1112.5) 314(800.5,1112.5) 315(780.5,1112.5) 316(760.5,1112.5) 317(740.5,1112.5) 318(720.5,1112.5) 319(700.5,1112.5) 320(680.5,1112.5) 321(660.5,1112.5) 322(640.5,1112.5) 323(620.5,1112.5) 324(600.5,1112.5) 325(580.5,1112.5) 326(560.5,1112.5) 327(540.5,1112.5) 328(520.5,1112.5) 329(500.5,1112.5) 330(480.5,1112.5) 331(460.5,1112.5) 332(440.5,1112.5) 333(420.5,1112.5) 334(400.5,1112.5) 335(380.5,1112.5) 336(360.5,1112.5) 337(340.5,1112.5) 338(320.5,1112.5) 339(300.5,1112.5) 340(280.5,1112.5) 341(260.5,1112.5) 342(240.5,1112.5) 343(220.5,1112.5) 344(200.5,1112.5) 345(180.5,1112.5) 346(160.5,1112.5) 347(140.5,1112.5) 348(120.5,1112.5) 349(100.5,1112.5) 350(80.5,1112.5) 351(60.5,1112.5) 352(40.5,1112.5) 353(20.5,1112.5) 354(0.5,1112.5) 355(-19.5,1112.5) 356(-39.5,1112.5) 357(-59.5,1112.5) 358(-79.5,1112.5) 359(-99.5,1112.5) 360(-119.5,1112.5) 361(-139.5,1112.5) 362(-159.5,1112.5) 363(-179.5,1112.5) 364(-199.5,1112.5) 365(-219.5,1112.5) 366(-239.5,1112.5) 367(-259.5,1112.5) 368(-279.5,1112.5) 369(-299.5,1112.5) 370(-319.5,1112.5) 371(-339.5,1112.5) 372(-359.5,1112.5) 373(-379.5,1112.5) 374(-399.5,1112.5) 375(-419.5,1112.5) 376(-439.5,1112.5) 377(-459.5,1112.5) 378(-479.5,1112.5) 379(-499.5,1112.5) 380(-519.5,1112.5) 381(-539.5,1112.5) 382(-559.5,1112.5) 383(-579.5,1112.5) 384(-599.5,1112.5) 385(-619.5,1112.5) 386(-639.5,1112.5) 387(-659.5,1112.5) 388(-679.5,1112.5) 389(-699.5,1112.5) 390(-719.5,1112.5) 391(-739.5,1112.5) 392(-759.5,1112.5) 393(-779.5,1112.5) 394(-799.5,1112.5) 395(-819.5,1112.5) 396(-839.5,1112.5) 397(-859.5,1112.5) 398(-879.5,1112.5) 399(-899.5,1112.5) 400(-919.5,1112.5) 401(-939.5,1112.5) 402(-959.5,1112.5) 403(-979.5,1112.5) 404(-999.5,1112.5)

## TAPE428-15 [mil]
pads (428):
  oval 75x8 smd: 1(-912.5,794.5) 2(-912.5,779.5) 3(-912.5,764.5) 4(-912.5,749.5) 5(-912.5,734.5) 6(-912.5,719.5) 7(-912.5,704.5) 8(-912.5,689.5) 9(-912.5,674.5) 10(-912.5,659.5) 11(-912.5,644.5) 12(-912.5,629.5) 13(-912.5,614.5) 14(-912.5,599.5) 15(-912.5,584.5) 16(-912.5,569.5) 17(-912.5,554.5) 18(-912.5,539.5) 19(-912.5,524.5) 20(-912.5,509.5) 21(-912.5,494.5) 22(-912.5,479.5) 23(-912.5,464.5) 24(-912.5,449.5) 25(-912.5,434.5) 26(-912.5,419.5) 27(-912.5,404.5) 28(-912.5,389.5) 29(-912.5,374.5) 30(-912.5,359.5) 31(-912.5,344.5) 32(-912.5,329.5) 33(-912.5,314.5) 34(-912.5,299.5) 35(-912.5,284.5) 36(-912.5,269.5) 37(-912.5,254.5) 38(-912.5,239.5) 39(-912.5,224.5) 40(-912.5,209.5) 41(-912.5,194.5) 42(-912.5,179.5) 43(-912.5,164.5) 44(-912.5,149.5) 45(-912.5,134.5) 46(-912.5,119.5) 47(-912.5,104.5) 48(-912.5,89.5) 49(-912.5,74.5) 50(-912.5,59.5) 51(-912.5,44.5) 52(-912.5,29.5) 53(-912.5,14.5) 54(-912.5,-0.5) 55(-912.5,-15.5) 56(-912.5,-30.5) 57(-912.5,-45.5) 58(-912.5,-60.5) 59(-912.5,-75.5) 60(-912.5,-90.5) 61(-912.5,-105.5) 62(-912.5,-120.5) 63(-912.5,-135.5) 64(-912.5,-150.5) 65(-912.5,-165.5) 66(-912.5,-180.5) 67(-912.5,-195.5) 68(-912.5,-210.5) 69(-912.5,-225.5) 70(-912.5,-240.5) 71(-912.5,-255.5) 72(-912.5,-270.5) 73(-912.5,-285.5) 74(-912.5,-300.5) 75(-912.5,-315.5) 76(-912.5,-330.5) 77(-912.5,-345.5) 78(-912.5,-360.5) 79(-912.5,-375.5) 80(-912.5,-390.5) 81(-912.5,-405.5) 82(-912.5,-420.5) 83(-912.5,-435.5) 84(-912.5,-450.5) 85(-912.5,-465.5) 86(-912.5,-480.5) 87(-912.5,-495.5) 88(-912.5,-510.5) 89(-912.5,-525.5) 90(-912.5,-540.5) 91(-912.5,-555.5) 92(-912.5,-570.5) 93(-912.5,-585.5) 94(-912.5,-600.5) 95(-912.5,-615.5) 96(-912.5,-630.5) 97(-912.5,-645.5) 98(-912.5,-660.5) 99(-912.5,-675.5) 100(-912.5,-690.5) 101(-912.5,-705.5) 102(-912.5,-720.5) 103(-912.5,-735.5) 104(-912.5,-750.5) 105(-912.5,-765.5) 106(-912.5,-780.5) 107(-912.5,-795.5) 215(912.5,-795.5) 216(912.5,-780.5) 217(912.5,-765.5) 218(912.5,-750.5) 219(912.5,-735.5) 220(912.5,-720.5) 221(912.5,-705.5) 222(912.5,-690.5) 223(912.5,-675.5) 224(912.5,-660.5) 225(912.5,-645.5) 226(912.5,-630.5) 227(912.5,-615.5) 228(912.5,-600.5) 229(912.5,-585.5) 230(912.5,-570.5) 231(912.5,-555.5) 232(912.5,-540.5) 233(912.5,-525.5) 234(912.5,-510.5) 235(912.5,-495.5) 236(912.5,-480.5) 237(912.5,-465.5) 238(912.5,-450.5) 239(912.5,-435.5) 240(912.5,-420.5) 241(912.5,-405.5) 242(912.5,-390.5) 243(912.5,-375.5) 244(912.5,-360.5) 245(912.5,-345.5) 246(912.5,-330.5) 247(912.5,-315.5) 248(912.5,-300.5) 249(912.5,-285.5) 250(912.5,-270.5) 251(912.5,-255.5) 252(912.5,-240.5) 253(912.5,-225.5) 254(912.5,-210.5) 255(912.5,-195.5) 256(912.5,-180.5) 257(912.5,-165.5) 258(912.5,-150.5) 259(912.5,-135.5) 260(912.5,-120.5) 261(912.5,-105.5) 262(912.5,-90.5) 263(912.5,-75.5) 264(912.5,-60.5) 265(912.5,-45.5) 266(912.5,-30.5) 267(912.5,-15.5) 268(912.5,-0.5) 269(912.5,14.5) 270(912.5,29.5) 271(912.5,44.5) 272(912.5,59.5) 273(912.5,74.5) 274(912.5,89.5) 275(912.5,104.5) 276(912.5,119.5) 277(912.5,134.5) 278(912.5,149.5) 279(912.5,164.5) 280(912.5,179.5) 281(912.5,194.5) 282(912.5,209.5) 283(912.5,224.5) 284(912.5,239.5) 285(912.5,254.5) 286(912.5,269.5) 287(912.5,284.5) 288(912.5,299.5) 289(912.5,314.5) 290(912.5,329.5) 291(912.5,344.5) 292(912.5,359.5) 293(912.5,374.5) 294(912.5,389.5) 295(912.5,404.5) 296(912.5,419.5) 297(912.5,434.5) 298(912.5,449.5) 299(912.5,464.5) 300(912.5,479.5) 301(912.5,494.5) 302(912.5,509.5) 303(912.5,524.5) 304(912.5,539.5) 305(912.5,554.5) 306(912.5,569.5) 307(912.5,584.5) 308(912.5,599.5) 309(912.5,614.5) 310(912.5,629.5) 311(912.5,644.5) 312(912.5,659.5) 313(912.5,674.5) 314(912.5,689.5) 315(912.5,704.5) 316(912.5,719.5) 317(912.5,734.5) 318(912.5,749.5) 319(912.5,764.5) 320(912.5,779.5) 321(912.5,794.5)
  oval 8x75 smd: 108(-794.5,-912.5) 109(-779.5,-912.5) 110(-764.5,-912.5) 111(-749.5,-912.5) 112(-734.5,-912.5) 113(-719.5,-912.5) 114(-704.5,-912.5) 115(-689.5,-912.5) 116(-674.5,-912.5) 117(-659.5,-912.5) 118(-644.5,-912.5) 119(-629.5,-912.5) 120(-614.5,-912.5) 121(-599.5,-912.5) 122(-584.5,-912.5) 123(-569.5,-912.5) 124(-554.5,-912.5) 125(-539.5,-912.5) 126(-524.5,-912.5) 127(-509.5,-912.5) 128(-494.5,-912.5) 129(-479.5,-912.5) 130(-464.5,-912.5) 131(-449.5,-912.5) 132(-434.5,-912.5) 133(-419.5,-912.5) 134(-404.5,-912.5) 135(-389.5,-912.5) 136(-374.5,-912.5) 137(-359.5,-912.5) 138(-344.5,-912.5) 139(-329.5,-912.5) 140(-314.5,-912.5) 141(-299.5,-912.5) 142(-284.5,-912.5) 143(-269.5,-912.5) 144(-254.5,-912.5) 145(-239.5,-912.5) 146(-224.5,-912.5) 147(-209.5,-912.5) 148(-194.5,-912.5) 149(-179.5,-912.5) 150(-164.5,-912.5) 151(-149.5,-912.5) 152(-134.5,-912.5) 153(-119.5,-912.5) 154(-104.5,-912.5) 155(-89.5,-912.5) 156(-74.5,-912.5) 157(-59.5,-912.5) 158(-44.5,-912.5) 159(-29.5,-912.5) 160(-14.5,-912.5) 161(0.5,-912.5) 162(15.5,-912.5) 163(30.5,-912.5) 164(45.5,-912.5) 165(60.5,-912.5) 166(75.5,-912.5) 167(90.5,-912.5) 168(105.5,-912.5) 169(120.5,-912.5) 170(135.5,-912.5) 171(150.5,-912.5) 172(165.5,-912.5) 173(180.5,-912.5) 174(195.5,-912.5) 175(210.5,-912.5) 176(225.5,-912.5) 177(240.5,-912.5) 178(255.5,-912.5) 179(270.5,-912.5) 180(285.5,-912.5) 181(300.5,-912.5) 182(315.5,-912.5) 183(330.5,-912.5) 184(345.5,-912.5) 185(360.5,-912.5) 186(375.5,-912.5) 187(390.5,-912.5) 188(405.5,-912.5) 189(420.5,-912.5) 190(435.5,-912.5) 191(450.5,-912.5) 192(465.5,-912.5) 193(480.5,-912.5) 194(495.5,-912.5) 195(510.5,-912.5) 196(525.5,-912.5) 197(540.5,-912.5) 198(555.5,-912.5) 199(570.5,-912.5) 200(585.5,-912.5) 201(600.5,-912.5) 202(615.5,-912.5) 203(630.5,-912.5) 204(645.5,-912.5) 205(660.5,-912.5) 206(675.5,-912.5) 207(690.5,-912.5) 208(705.5,-912.5) 209(720.5,-912.5) 210(735.5,-912.5) 211(750.5,-912.5) 212(765.5,-912.5) 213(780.5,-912.5) 214(795.5,-912.5) 322(795.5,912.5) 323(780.5,912.5) 324(765.5,912.5) 325(750.5,912.5) 326(735.5,912.5) 327(720.5,912.5) 328(705.5,912.5) 329(690.5,912.5) 330(675.5,912.5) 331(660.5,912.5) 332(645.5,912.5) 333(630.5,912.5) 334(615.5,912.5) 335(600.5,912.5) 336(585.5,912.5) 337(570.5,912.5) 338(555.5,912.5) 339(540.5,912.5) 340(525.5,912.5) 341(510.5,912.5) 342(495.5,912.5) 343(480.5,912.5) 344(465.5,912.5) 345(450.5,912.5) 346(435.5,912.5) 347(420.5,912.5) 348(405.5,912.5) 349(390.5,912.5) 350(375.5,912.5) 351(360.5,912.5) 352(345.5,912.5) 353(330.5,912.5) 354(315.5,912.5) 355(300.5,912.5) 356(285.5,912.5) 357(270.5,912.5) 358(255.5,912.5) 359(240.5,912.5) 360(225.5,912.5) 361(210.5,912.5) 362(195.5,912.5) 363(180.5,912.5) 364(165.5,912.5) 365(150.5,912.5) 366(135.5,912.5) 367(120.5,912.5) 368(105.5,912.5) 369(90.5,912.5) 370(75.5,912.5) 371(60.5,912.5) 372(45.5,912.5) 373(30.5,912.5) 374(15.5,912.5) 375(0.5,912.5) 376(-14.5,912.5) 377(-29.5,912.5) 378(-44.5,912.5) 379(-59.5,912.5) 380(-74.5,912.5) 381(-89.5,912.5) 382(-104.5,912.5) 383(-119.5,912.5) 384(-134.5,912.5) 385(-149.5,912.5) 386(-164.5,912.5) 387(-179.5,912.5) 388(-194.5,912.5) 389(-209.5,912.5) 390(-224.5,912.5) 391(-239.5,912.5) 392(-254.5,912.5) 393(-269.5,912.5) 394(-284.5,912.5) 395(-299.5,912.5) 396(-314.5,912.5) 397(-329.5,912.5) 398(-344.5,912.5) 399(-359.5,912.5) 400(-374.5,912.5) 401(-389.5,912.5) 402(-404.5,912.5) 403(-419.5,912.5) 404(-434.5,912.5) 405(-449.5,912.5) 406(-464.5,912.5) 407(-479.5,912.5) 408(-494.5,912.5) 409(-509.5,912.5) 410(-524.5,912.5) 411(-539.5,912.5) 412(-554.5,912.5) 413(-569.5,912.5) 414(-584.5,912.5) 415(-599.5,912.5) 416(-614.5,912.5) 417(-629.5,912.5) 418(-644.5,912.5) 419(-659.5,912.5) 420(-674.5,912.5) 421(-689.5,912.5) 422(-704.5,912.5) 423(-719.5,912.5) 424(-734.5,912.5) 425(-749.5,912.5) 426(-764.5,912.5) 427(-779.5,912.5) 428(-794.5,912.5)

## TAPE484-10 [mil]
pads (484):
  oval 75x5 smd: 1(-712.5,599.5) 2(-712.5,589.5) 3(-712.5,579.5) 4(-712.5,569.5) 5(-712.5,559.5) 6(-712.5,549.5) 7(-712.5,539.5) 8(-712.5,529.5) 9(-712.5,519.5) 10(-712.5,509.5) 11(-712.5,499.5) 12(-712.5,489.5) 13(-712.5,479.5) 14(-712.5,469.5) 15(-712.5,459.5) 16(-712.5,449.5) 17(-712.5,439.5) 18(-712.5,429.5) 19(-712.5,419.5) 20(-712.5,409.5) 21(-712.5,399.5) 22(-712.5,389.5) 23(-712.5,379.5) 24(-712.5,369.5) 25(-712.5,359.5) 26(-712.5,349.5) 27(-712.5,339.5) 28(-712.5,329.5) 29(-712.5,319.5) 30(-712.5,309.5) 31(-712.5,299.5) 32(-712.5,289.5) 33(-712.5,279.5) 34(-712.5,269.5) 35(-712.5,259.5) 36(-712.5,249.5) 37(-712.5,239.5) 38(-712.5,229.5) 39(-712.5,219.5) 40(-712.5,209.5) 41(-712.5,199.5) 42(-712.5,189.5) 43(-712.5,179.5) 44(-712.5,169.5) 45(-712.5,159.5) 46(-712.5,149.5) 47(-712.5,139.5) 48(-712.5,129.5) 49(-712.5,119.5) 50(-712.5,109.5) 51(-712.5,99.5) 52(-712.5,89.5) 53(-712.5,79.5) 54(-712.5,69.5) 55(-712.5,59.5) 56(-712.5,49.5) 57(-712.5,39.5) 58(-712.5,29.5) 59(-712.5,19.5) 60(-712.5,9.5) 61(-712.5,-0.5) 62(-712.5,-10.5) 63(-712.5,-20.5) 64(-712.5,-30.5) 65(-712.5,-40.5) 66(-712.5,-50.5) 67(-712.5,-60.5) 68(-712.5,-70.5) 69(-712.5,-80.5) 70(-712.5,-90.5) 71(-712.5,-100.5) 72(-712.5,-110.5) 73(-712.5,-120.5) 74(-712.5,-130.5) 75(-712.5,-140.5) 76(-712.5,-150.5) 77(-712.5,-160.5) 78(-712.5,-170.5) 79(-712.5,-180.5) 80(-712.5,-190.5) 81(-712.5,-200.5) 82(-712.5,-210.5) 83(-712.5,-220.5) 84(-712.5,-230.5) 85(-712.5,-240.5) 86(-712.5,-250.5) 87(-712.5,-260.5) 88(-712.5,-270.5) 89(-712.5,-280.5) 90(-712.5,-290.5) 91(-712.5,-300.5) 92(-712.5,-310.5) 93(-712.5,-320.5) 94(-712.5,-330.5) 95(-712.5,-340.5) 96(-712.5,-350.5) 97(-712.5,-360.5) 98(-712.5,-370.5) 99(-712.5,-380.5) 100(-712.5,-390.5) 101(-712.5,-400.5) 102(-712.5,-410.5) 103(-712.5,-420.5) 104(-712.5,-430.5) 105(-712.5,-440.5) 106(-712.5,-450.5) 107(-712.5,-460.5) 108(-712.5,-470.5) 109(-712.5,-480.5) 110(-712.5,-490.5) 111(-712.5,-500.5) 112(-712.5,-510.5) 113(-712.5,-520.5) 114(-712.5,-530.5) 115(-712.5,-540.5) 116(-712.5,-550.5) 117(-712.5,-560.5) 118(-712.5,-570.5) 119(-712.5,-580.5) 120(-712.5,-590.5) 121(-712.5,-600.5) 243(712.5,-600.5) 244(712.5,-590.5) 245(712.5,-580.5) 246(712.5,-570.5) 247(712.5,-560.5) 248(712.5,-550.5) 249(712.5,-540.5) 250(712.5,-530.5) 251(712.5,-520.5) 252(712.5,-510.5) 253(712.5,-500.5) 254(712.5,-490.5) 255(712.5,-480.5) 256(712.5,-470.5) 257(712.5,-460.5) 258(712.5,-450.5) 259(712.5,-440.5) 260(712.5,-430.5) 261(712.5,-420.5) 262(712.5,-410.5) 263(712.5,-400.5) 264(712.5,-390.5) 265(712.5,-380.5) 266(712.5,-370.5) 267(712.5,-360.5) 268(712.5,-350.5) 269(712.5,-340.5) 270(712.5,-330.5) 271(712.5,-320.5) 272(712.5,-310.5) 273(712.5,-300.5) 274(712.5,-290.5) 275(712.5,-280.5) 276(712.5,-270.5) 277(712.5,-260.5) 278(712.5,-250.5) 279(712.5,-240.5) 280(712.5,-230.5) 281(712.5,-220.5) 282(712.5,-210.5) 283(712.5,-200.5) 284(712.5,-190.5) 285(712.5,-180.5) 286(712.5,-170.5) 287(712.5,-160.5) 288(712.5,-150.5) 289(712.5,-140.5) 290(712.5,-130.5) 291(712.5,-120.5) 292(712.5,-110.5) 293(712.5,-100.5) 294(712.5,-90.5) 295(712.5,-80.5) 296(712.5,-70.5) 297(712.5,-60.5) 298(712.5,-50.5) 299(712.5,-40.5) 300(712.5,-30.5) 301(712.5,-20.5) 302(712.5,-10.5) 303(712.5,-0.5) 304(712.5,9.5) 305(712.5,19.5) 306(712.5,29.5) 307(712.5,39.5) 308(712.5,49.5) 309(712.5,59.5) 310(712.5,69.5) 311(712.5,79.5) 312(712.5,89.5) 313(712.5,99.5) 314(712.5,109.5) 315(712.5,119.5) 316(712.5,129.5) 317(712.5,139.5) 318(712.5,149.5) 319(712.5,159.5) 320(712.5,169.5) 321(712.5,179.5) 322(712.5,189.5) 323(712.5,199.5) 324(712.5,209.5) 325(712.5,219.5) 326(712.5,229.5) 327(712.5,239.5) 328(712.5,249.5) 329(712.5,259.5) 330(712.5,269.5) 331(712.5,279.5) 332(712.5,289.5) 333(712.5,299.5) 334(712.5,309.5) 335(712.5,319.5) 336(712.5,329.5) 337(712.5,339.5) 338(712.5,349.5) 339(712.5,359.5) 340(712.5,369.5) 341(712.5,379.5) 342(712.5,389.5) 343(712.5,399.5) 344(712.5,409.5) 345(712.5,419.5) 346(712.5,429.5) 347(712.5,439.5) 348(712.5,449.5) 349(712.5,459.5) 350(712.5,469.5) 351(712.5,479.5) 352(712.5,489.5) 353(712.5,499.5) 354(712.5,509.5) 355(712.5,519.5) 356(712.5,529.5) 357(712.5,539.5) 358(712.5,549.5) 359(712.5,559.5) 360(712.5,569.5) 361(712.5,579.5) 362(712.5,589.5) 363(712.5,599.5)
  oval 5x75 smd: 122(-599.5,-712.5) 123(-589.5,-712.5) 124(-579.5,-712.5) 125(-569.5,-712.5) 126(-559.5,-712.5) 127(-549.5,-712.5) 128(-539.5,-712.5) 129(-529.5,-712.5) 130(-519.5,-712.5) 131(-509.5,-712.5) 132(-499.5,-712.5) 133(-489.5,-712.5) 134(-479.5,-712.5) 135(-469.5,-712.5) 136(-459.5,-712.5) 137(-449.5,-712.5) 138(-439.5,-712.5) 139(-429.5,-712.5) 140(-419.5,-712.5) 141(-409.5,-712.5) 142(-399.5,-712.5) 143(-389.5,-712.5) 144(-379.5,-712.5) 145(-369.5,-712.5) 146(-359.5,-712.5) 147(-349.5,-712.5) 148(-339.5,-712.5) 149(-329.5,-712.5) 150(-319.5,-712.5) 151(-309.5,-712.5) 152(-299.5,-712.5) 153(-289.5,-712.5) 154(-279.5,-712.5) 155(-269.5,-712.5) 156(-259.5,-712.5) 157(-249.5,-712.5) 158(-239.5,-712.5) 159(-229.5,-712.5) 160(-219.5,-712.5) 161(-209.5,-712.5) 162(-199.5,-712.5) 163(-189.5,-712.5) 164(-179.5,-712.5) 165(-169.5,-712.5) 166(-159.5,-712.5) 167(-149.5,-712.5) 168(-139.5,-712.5) 169(-129.5,-712.5) 170(-119.5,-712.5) 171(-109.5,-712.5) 172(-99.5,-712.5) 173(-89.5,-712.5) 174(-79.5,-712.5) 175(-69.5,-712.5) 176(-59.5,-712.5) 177(-49.5,-712.5) 178(-39.5,-712.5) 179(-29.5,-712.5) 180(-19.5,-712.5) 181(-9.5,-712.5) 182(0.5,-712.5) 183(10.5,-712.5) 184(20.5,-712.5) 185(30.5,-712.5) 186(40.5,-712.5) 187(50.5,-712.5) 188(60.5,-712.5) 189(70.5,-712.5) 190(80.5,-712.5) 191(90.5,-712.5) 192(100.5,-712.5) 193(110.5,-712.5) 194(120.5,-712.5) 195(130.5,-712.5) 196(140.5,-712.5) 197(150.5,-712.5) 198(160.5,-712.5) 199(170.5,-712.5) 200(180.5,-712.5) 201(190.5,-712.5) 202(200.5,-712.5) 203(210.5,-712.5) 204(220.5,-712.5) 205(230.5,-712.5) 206(240.5,-712.5) 207(250.5,-712.5) 208(260.5,-712.5) 209(270.5,-712.5) 210(280.5,-712.5) 211(290.5,-712.5) 212(300.5,-712.5) 213(310.5,-712.5) 214(320.5,-712.5) 215(330.5,-712.5) 216(340.5,-712.5) 217(350.5,-712.5) 218(360.5,-712.5) 219(370.5,-712.5) 220(380.5,-712.5) 221(390.5,-712.5) 222(400.5,-712.5) 223(410.5,-712.5) 224(420.5,-712.5) 225(430.5,-712.5) 226(440.5,-712.5) 227(450.5,-712.5) 228(460.5,-712.5) 229(470.5,-712.5) 230(480.5,-712.5) 231(490.5,-712.5) 232(500.5,-712.5) 233(510.5,-712.5) 234(520.5,-712.5) 235(530.5,-712.5) 236(540.5,-712.5) 237(550.5,-712.5) 238(560.5,-712.5) 239(570.5,-712.5) 240(580.5,-712.5) 241(590.5,-712.5) 242(600.5,-712.5) 364(600.5,712.5) 365(590.5,712.5) 366(580.5,712.5) 367(570.5,712.5) 368(560.5,712.5) 369(550.5,712.5) 370(540.5,712.5) 371(530.5,712.5) 372(520.5,712.5) 373(510.5,712.5) 374(500.5,712.5) 375(490.5,712.5) 376(480.5,712.5) 377(470.5,712.5) 378(460.5,712.5) 379(450.5,712.5) 380(440.5,712.5) 381(430.5,712.5) 382(420.5,712.5) 383(410.5,712.5) 384(400.5,712.5) 385(390.5,712.5) 386(380.5,712.5) 387(370.5,712.5) 388(360.5,712.5) 389(350.5,712.5) 390(340.5,712.5) 391(330.5,712.5) 392(320.5,712.5) 393(310.5,712.5) 394(300.5,712.5) 395(290.5,712.5) 396(280.5,712.5) 397(270.5,712.5) 398(260.5,712.5) 399(250.5,712.5) 400(240.5,712.5) 401(230.5,712.5) 402(220.5,712.5) 403(210.5,712.5) 404(200.5,712.5) 405(190.5,712.5) 406(180.5,712.5) 407(170.5,712.5) 408(160.5,712.5) 409(150.5,712.5) 410(140.5,712.5) 411(130.5,712.5) 412(120.5,712.5) 413(110.5,712.5) 414(100.5,712.5) 415(90.5,712.5) 416(80.5,712.5) 417(70.5,712.5) 418(60.5,712.5) 419(50.5,712.5) 420(40.5,712.5) 421(30.5,712.5) 422(20.5,712.5) 423(10.5,712.5) 424(0.5,712.5) 425(-9.5,712.5) 426(-19.5,712.5) 427(-29.5,712.5) 428(-39.5,712.5) 429(-49.5,712.5) 430(-59.5,712.5) 431(-69.5,712.5) 432(-79.5,712.5) 433(-89.5,712.5) 434(-99.5,712.5) 435(-109.5,712.5) 436(-119.5,712.5) 437(-129.5,712.5) 438(-139.5,712.5) 439(-149.5,712.5) 440(-159.5,712.5) 441(-169.5,712.5) 442(-179.5,712.5) 443(-189.5,712.5) 444(-199.5,712.5) 445(-209.5,712.5) 446(-219.5,712.5) 447(-229.5,712.5) 448(-239.5,712.5) 449(-249.5,712.5) 450(-259.5,712.5) 451(-269.5,712.5) 452(-279.5,712.5) 453(-289.5,712.5) 454(-299.5,712.5) 455(-309.5,712.5) 456(-319.5,712.5) 457(-329.5,712.5) 458(-339.5,712.5) 459(-349.5,712.5) 460(-359.5,712.5) 461(-369.5,712.5) 462(-379.5,712.5) 463(-389.5,712.5) 464(-399.5,712.5) 465(-409.5,712.5) 466(-419.5,712.5) 467(-429.5,712.5) 468(-439.5,712.5) 469(-449.5,712.5) 470(-459.5,712.5) 471(-469.5,712.5) 472(-479.5,712.5) 473(-489.5,712.5) 474(-499.5,712.5) 475(-509.5,712.5) 476(-519.5,712.5) 477(-529.5,712.5) 478(-539.5,712.5) 479(-549.5,712.5) 480(-559.5,712.5) 481(-569.5,712.5) 482(-579.5,712.5) 483(-589.5,712.5) 484(-599.5,712.5)